# Altium integrated library Samtec_2,54_mm_Pitch_Socket_Strips.IntLib: 489 symbols (part 4 of 4) (continued)
## SSW-120-22-L-D-VS-N (continued)
SQ Post Socket, Surface Mount, Vertical, -55 to 125 degC, 2.54 mm Pitch, 40-Pin, Female, RoHS; Manufacturer: Samtec; PartNumber: SSW-120-22-L-D-VS-N; Pitch: 2.54 mm; DatasheetVersion: F-214; PackageVersion: AS, 1/1997; PackageReference: SSW-120-22-X-D-VS-N; PackageDescription: .100 [2.54] Surface Mount Assembly; Orientation: Vertical; RoHS: True; Temperature Range: -55 to 125 degC; Mounting Technology: Surface Mount; ComponentLink1Description: Manufacturer URL; ComponentLink1URL: http://www.samtec.com; ComponentLink2Description: Datasheet; ComponentLink2URL: http://www.samtec.com/documents/webfiles/pdf/SSW_SM.PDF; ComponentLink3Description: Package Specification; ComponentLink3URL: http://www.samtec.com/documents/webfiles/cpdf/SSW-1XX-22-XXX-X-XX-XX-X-XX-MKT.pdf
footprint SMTC-SSW-120-22-X-D-VS-N (SQ Post Socket, 2x20 Pins, Vertical, 2.54mm Pitch, Female)
pins: 1, 2, 3, 4, 5, 6, 7, 8, 9, 10, 11, 12, 13, 14, 15, 16, 17, 18, 19, 20, 21, 22, 23, 24, 25, 26, 27, 28, 29, 30, 31, 32, 33, 34, 35, 36, 37, 38, 39, 40

## SSW-120-22-L-D-VS-P
designator J?
SQ Post Socket, Surface Mount, Vertical, -55 to 125 degC, 2.54 mm Pitch, 40-Pin, Female, RoHS; Manufacturer: Samtec; PartNumber: SSW-120-22-L-D-VS-P; Pitch: 2.54 mm; DatasheetVersion: F-214; PackageVersion: AS, 1/1997; PackageReference: SSW-120-22-X-D-VS-P; PackageDescription: .100 [2.54] Surface Mount Assembly; Orientation: Vertical; RoHS: True; Temperature Range: -55 to 125 degC; Mounting Technology: Surface Mount; ComponentLink1Description: Manufacturer URL; ComponentLink1URL: http://www.samtec.com; ComponentLink2Description: Datasheet; ComponentLink2URL: http://www.samtec.com/documents/webfiles/pdf/SSW_SM.PDF; ComponentLink3Description: Package Specification; ComponentLink3URL: http://www.samtec.com/documents/webfiles/cpdf/SSW-1XX-22-XXX-X-XX-XX-X-XX-MKT.pdf
footprint SMTC-SSW-120-22-X-D-VS-P (SQ Post Socket, 2x20 Pins, Vertical, 2.54mm Pitch, Female)
pins: 1, 2, 3, 4, 5, 6, 7, 8, 9, 10, 11, 12, 13, 14, 15, 16, 17, 18, 19, 20, 21, 22, 23, 24, 25, 26, 27, 28, 29, 30, 31, 32, 33, 34, 35, 36, 37, 38, 39, 40

## SSW-123-06-F-D
designator J?
SQ Post Socket, Through-hole, Vertical, -55 to 125 degC, 2.54 mm Pitch, 46-Pin, Female, RoHS; Manufacturer: Samtec; PartNumber: SSW-123-06-F-D; Pitch: 2.54 mm; DatasheetVersion: F-214; PackageVersion: CA, 6/1987; PackageReference: SSW-123-06-X-D; PackageDescription: Assembly, Socket Strip .016 X .031 Tail; Orientation: Vertical; RoHS: True; Temperature Range: -55 to 125 degC; Mounting Technology: Through-hole; ComponentLink1Description: Manufacturer URL; ComponentLink1URL: http://www.samtec.com; ComponentLink2Description: Datasheet; ComponentLink2URL: http://www.samtec.com/documents/webfiles/pdf/SSW_TH.PDF; ComponentLink3Description: Package Specification; ComponentLink3URL: http://www.samtec.com/documents/webfiles/cpdf/SSW-1XX-XX-XXX-X-XX-XXX-XX-MKT.pdf
footprint SMTC-SSW-123-06-X-D (SQ Post Socket, 2x23 Pins, Vertical, 2.54mm Pitch, Female)
pins: 1, 2, 3, 4, 5, 6, 7, 8, 9, 10, 11, 12, 13, 14, 15, 16, 17, 18, 19, 20, 21, 22, 23, 24, 25, 26, 27, 28, 29, 30, 31, 32, 33, 34, 35, 36, 37, 38, 39, 40, 41, 42, 43, 44, 45, 46

## SSW-123-06-G-D
designator J?
SQ Post Socket, Through-hole, Vertical, -55 to 125 degC, 2.54 mm Pitch, 46-Pin, Female, RoHS; Manufacturer: Samtec; PartNumber: SSW-123-06-G-D; Pitch: 2.54 mm; DatasheetVersion: F-214; PackageVersion: CA, 6/1987; PackageReference: SSW-123-06-X-D; PackageDescription: Assembly, Socket Strip .016 X .031 Tail; Orientation: Vertical; RoHS: True; Temperature Range: -55 to 125 degC; Mounting Technology: Through-hole; ComponentLink1Description: Manufacturer URL; ComponentLink1URL: http://www.samtec.com; ComponentLink2Description: Datasheet; ComponentLink2URL: http://www.samtec.com/documents/webfiles/pdf/SSW_TH.PDF; ComponentLink3Description: Package Specification; ComponentLink3URL: http://www.samtec.com/documents/webfiles/cpdf/SSW-1XX-XX-XXX-X-XX-XXX-XX-MKT.pdf
footprint SMTC-SSW-123-06-X-D (SQ Post Socket, 2x23 Pins, Vertical, 2.54mm Pitch, Female)
pins: 1, 2, 3, 4, 5, 6, 7, 8, 9, 10, 11, 12, 13, 14, 15, 16, 17, 18, 19, 20, 21, 22, 23, 24, 25, 26, 27, 28, 29, 30, 31, 32, 33, 34, 35, 36, 37, 38, 39, 40, 41, 42, 43, 44, 45, 46

## SSW-123-06-L-D
designator J?
SQ Post Socket, Through-hole, Vertical, -55 to 125 degC, 2.54 mm Pitch, 46-Pin, Female, RoHS; Manufacturer: Samtec; PartNumber: SSW-123-06-L-D; Pitch: 2.54 mm; DatasheetVersion: F-214; PackageVersion: CA, 6/1987; PackageReference: SSW-123-06-X-D; PackageDescription: Assembly, Socket Strip .016 X .031 Tail; Orientation: Vertical; RoHS: True; Temperature Range: -55 to 125 degC; Mounting Technology: Through-hole; ComponentLink1Description: Manufacturer URL; ComponentLink1URL: http://www.samtec.com; ComponentLink2Description: Datasheet; ComponentLink2URL: http://www.samtec.com/documents/webfiles/pdf/SSW_TH.PDF; ComponentLink3Description: Package Specification; ComponentLink3URL: http://www.samtec.com/documents/webfiles/cpdf/SSW-1XX-XX-XXX-X-XX-XXX-XX-MKT.pdf
footprint SMTC-SSW-123-06-X-D (SQ Post Socket, 2x23 Pins, Vertical, 2.54mm Pitch, Female)
pins: 1, 2, 3, 4, 5, 6, 7, 8, 9, 10, 11, 12, 13, 14, 15, 16, 17, 18, 19, 20, 21, 22, 23, 24, 25, 26, 27, 28, 29, 30, 31, 32, 33, 34, 35, 36, 37, 38, 39, 40, 41, 42, 43, 44, 45, 46

## SSW-123-06-T-D
designator J?
SQ Post Socket, Through-hole, Vertical, -55 to 105 degC, 2.54 mm Pitch, 46-Pin, Female, RoHS; Manufacturer: Samtec; PartNumber: SSW-123-06-T-D; Pitch: 2.54 mm; DatasheetVersion: F-214; PackageVersion: CA, 6/1987; PackageReference: SSW-123-06-X-D; PackageDescription: Assembly, Socket Strip .016 X .031 Tail; Orientation: Vertical; RoHS: True; Temperature Range: -55 to 105 degC; Mounting Technology: Through-hole; ComponentLink1Description: Manufacturer URL; ComponentLink1URL: http://www.samtec.com; ComponentLink2Description: Datasheet; ComponentLink2URL: http://www.samtec.com/documents/webfiles/pdf/SSW_TH.PDF; ComponentLink3Description: Package Specification; ComponentLink3URL: http://www.samtec.com/documents/webfiles/cpdf/SSW-1XX-XX-XXX-X-XX-XXX-XX-MKT.pdf
footprint SMTC-SSW-123-06-X-D (SQ Post Socket, 2x23 Pins, Vertical, 2.54mm Pitch, Female)
pins: 1, 2, 3, 4, 5, 6, 7, 8, 9, 10, 11, 12, 13, 14, 15, 16, 17, 18, 19, 20, 21, 22, 23, 24, 25, 26, 27, 28, 29, 30, 31, 32, 33, 34, 35, 36, 37, 38, 39, 40, 41, 42, 43, 44, 45, 46

## SSW-125-01-F-D
designator J?
SQ Post Socket, Through-hole, Vertical, -55 to 125 degC, 2.54 mm Pitch, 50-Pin, Female, RoHS; Manufacturer: Samtec; PartNumber: SSW-125-01-F-D; Pitch: 2.54 mm; DatasheetVersion: F-214; PackageVersion: CA, 6/1987; PackageReference: SSW-125-01-X-D; PackageDescription: Assembly, Socket Strip .016 X .031 Tail; Supplier 1: Newark; Supplier Part Number 1: 40P2157; Orientation: Vertical; RoHS: True; Temperature Range: -55 to 125 degC; Mounting Technology: Through-hole; ComponentLink1Description: Manufacturer URL; ComponentLink1URL: http://www.samtec.com; ComponentLink2Description: Datasheet; ComponentLink2URL: http://www.samtec.com/documents/webfiles/pdf/SSW_TH.PDF; ComponentLink3Description: Package Specification; ComponentLink3URL: http://www.samtec.com/documents/webfiles/cpdf/SSW-1XX-XX-XXX-X-XX-XXX-XX-MKT.pdf
footprint SMTC-SSW-125-01-X-D (SQ Post Socket, 2x25 Pins, Vertical, 2.54mm Pitch, Female)
pins: 1, 2, 3, 4, 5, 6, 7, 8, 9, 10, 11, 12, 13, 14, 15, 16, 17, 18, 19, 20, 21, 22, 23, 24, 25, 26, 27, 28, 29, 30, 31, 32, 33, 34, 35, 36, 37, 38, 39, 40, 41, 42, 43, 44, 45, 46, 47, 48, 49, 50

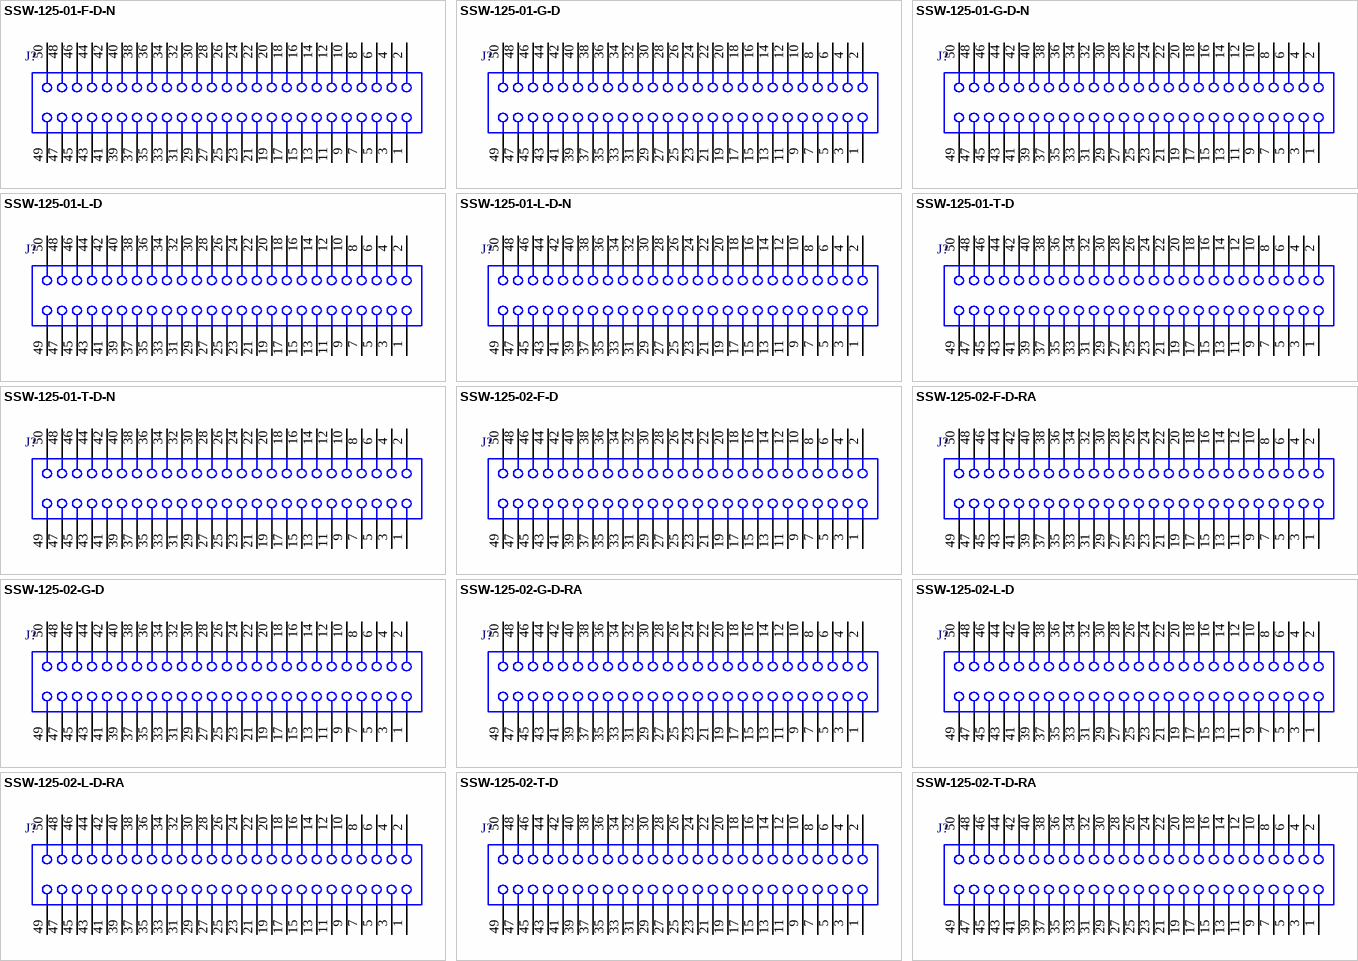
[diagram p13: symbols SSW-125-01-F-D-N to SSW-125-02-T-D-RA]

## SSW-125-01-F-D-N
designator J?
SQ Post Socket, Through-hole, Vertical, -55 to 125 degC, 2.54 mm Pitch, 50-Pin, Female, RoHS; Manufacturer: Samtec; PartNumber: SSW-125-01-F-D-N; Pitch: 2.54 mm; DatasheetVersion: F-214; PackageVersion: CA, 6/1987; PackageReference: SSW-125-01-X-D-N; PackageDescription: Assembly, Socket Strip .016 X .031 Tail; Orientation: Vertical; RoHS: True; Temperature Range: -55 to 125 degC; Mounting Technology: Through-hole; ComponentLink1Description: Manufacturer URL; ComponentLink1URL: http://www.samtec.com; ComponentLink2Description: Datasheet; ComponentLink2URL: http://www.samtec.com/documents/webfiles/pdf/SSW_TH.PDF; ComponentLink3Description: Package Specification; ComponentLink3URL: http://www.samtec.com/documents/webfiles/cpdf/SSW-1XX-XX-XXX-X-XX-XXX-XX-MKT.pdf
footprint SMTC-SSW-125-01-X-D-N (SQ Post Socket, 2x25 Pins, Vertical, 2.54mm Pitch, Female)
pins: 1, 2, 3, 4, 5, 6, 7, 8, 9, 10, 11, 12, 13, 14, 15, 16, 17, 18, 19, 20, 21, 22, 23, 24, 25, 26, 27, 28, 29, 30, 31, 32, 33, 34, 35, 36, 37, 38, 39, 40, 41, 42, 43, 44, 45, 46, 47, 48, 49, 50

## SSW-125-01-G-D
designator J?
SQ Post Socket, Through-hole, Vertical, -55 to 125 degC, 2.54 mm Pitch, 50-Pin, Female, RoHS; Manufacturer: Samtec; PartNumber: SSW-125-01-G-D; Pitch: 2.54 mm; DatasheetVersion: F-214; PackageVersion: CA, 6/1987; PackageReference: SSW-125-01-X-D; PackageDescription: Assembly, Socket Strip .016 X .031 Tail; Supplier 1: Digi-Key; Supplier Part Number 1: SAM1208-25-ND; Supplier 2: Farnell; Supplier Part Number 2: 1668403; Supplier 3: Newark; Supplier Part Number 3: 11P9714; Orientation: Vertical; RoHS: True; Temperature Range: -55 to 125 degC; Mounting Technology: Through-hole; ComponentLink1Description: Manufacturer URL; ComponentLink1URL: http://www.samtec.com; ComponentLink2Description: Datasheet; ComponentLink2URL: http://www.samtec.com/documents/webfiles/pdf/SSW_TH.PDF; ComponentLink3Description: Package Specification; ComponentLink3URL: http://www.samtec.com/documents/webfiles/cpdf/SSW-1XX-XX-XXX-X-XX-XXX-XX-MKT.pdf
footprint SMTC-SSW-125-01-X-D (SQ Post Socket, 2x25 Pins, Vertical, 2.54mm Pitch, Female)
pins: 1, 2, 3, 4, 5, 6, 7, 8, 9, 10, 11, 12, 13, 14, 15, 16, 17, 18, 19, 20, 21, 22, 23, 24, 25, 26, 27, 28, 29, 30, 31, 32, 33, 34, 35, 36, 37, 38, 39, 40, 41, 42, 43, 44, 45, 46, 47, 48, 49, 50

## SSW-125-01-G-D-N
designator J?
SQ Post Socket, Through-hole, Vertical, -55 to 125 degC, 2.54 mm Pitch, 50-Pin, Female, RoHS; Manufacturer: Samtec; PartNumber: SSW-125-01-G-D-N; Pitch: 2.54 mm; DatasheetVersion: F-214; PackageVersion: CA, 6/1987; PackageReference: SSW-125-01-X-D-N; PackageDescription: Assembly, Socket Strip .016 X .031 Tail; Orientation: Vertical; RoHS: True; Temperature Range: -55 to 125 degC; Mounting Technology: Through-hole; ComponentLink1Description: Manufacturer URL; ComponentLink1URL: http://www.samtec.com; ComponentLink2Description: Datasheet; ComponentLink2URL: http://www.samtec.com/documents/webfiles/pdf/SSW_TH.PDF; ComponentLink3Description: Package Specification; ComponentLink3URL: http://www.samtec.com/documents/webfiles/cpdf/SSW-1XX-XX-XXX-X-XX-XXX-XX-MKT.pdf
footprint SMTC-SSW-125-01-X-D-N (SQ Post Socket, 2x25 Pins, Vertical, 2.54mm Pitch, Female)
pins: 1, 2, 3, 4, 5, 6, 7, 8, 9, 10, 11, 12, 13, 14, 15, 16, 17, 18, 19, 20, 21, 22, 23, 24, 25, 26, 27, 28, 29, 30, 31, 32, 33, 34, 35, 36, 37, 38, 39, 40, 41, 42, 43, 44, 45, 46, 47, 48, 49, 50

## SSW-125-01-L-D
designator J?
SQ Post Socket, Through-hole, Vertical, -55 to 125 degC, 2.54 mm Pitch, 50-Pin, Female, RoHS; Manufacturer: Samtec; PartNumber: SSW-125-01-L-D; Pitch: 2.54 mm; DatasheetVersion: F-214; PackageVersion: CA, 6/1987; PackageReference: SSW-125-01-X-D; PackageDescription: Assembly, Socket Strip .016 X .031 Tail; Supplier 1: Newark; Supplier Part Number 1: 44W9136; Orientation: Vertical; RoHS: True; Temperature Range: -55 to 125 degC; Mounting Technology: Through-hole; ComponentLink1Description: Manufacturer URL; ComponentLink1URL: http://www.samtec.com; ComponentLink2Description: Datasheet; ComponentLink2URL: http://www.samtec.com/documents/webfiles/pdf/SSW_TH.PDF; ComponentLink3Description: Package Specification; ComponentLink3URL: http://www.samtec.com/documents/webfiles/cpdf/SSW-1XX-XX-XXX-X-XX-XXX-XX-MKT.pdf
footprint SMTC-SSW-125-01-X-D (SQ Post Socket, 2x25 Pins, Vertical, 2.54mm Pitch, Female)
pins: 1, 2, 3, 4, 5, 6, 7, 8, 9, 10, 11, 12, 13, 14, 15, 16, 17, 18, 19, 20, 21, 22, 23, 24, 25, 26, 27, 28, 29, 30, 31, 32, 33, 34, 35, 36, 37, 38, 39, 40, 41, 42, 43, 44, 45, 46, 47, 48, 49, 50

## SSW-125-01-L-D-N
designator J?
SQ Post Socket, Through-hole, Vertical, -55 to 125 degC, 2.54 mm Pitch, 50-Pin, Female, RoHS; Manufacturer: Samtec; PartNumber: SSW-125-01-L-D-N; Pitch: 2.54 mm; DatasheetVersion: F-214; PackageVersion: CA, 6/1987; PackageReference: SSW-125-01-X-D-N; PackageDescription: Assembly, Socket Strip .016 X .031 Tail; Orientation: Vertical; RoHS: True; Temperature Range: -55 to 125 degC; Mounting Technology: Through-hole; ComponentLink1Description: Manufacturer URL; ComponentLink1URL: http://www.samtec.com; ComponentLink2Description: Datasheet; ComponentLink2URL: http://www.samtec.com/documents/webfiles/pdf/SSW_TH.PDF; ComponentLink3Description: Package Specification; ComponentLink3URL: http://www.samtec.com/documents/webfiles/cpdf/SSW-1XX-XX-XXX-X-XX-XXX-XX-MKT.pdf
footprint SMTC-SSW-125-01-X-D-N (SQ Post Socket, 2x25 Pins, Vertical, 2.54mm Pitch, Female)
pins: 1, 2, 3, 4, 5, 6, 7, 8, 9, 10, 11, 12, 13, 14, 15, 16, 17, 18, 19, 20, 21, 22, 23, 24, 25, 26, 27, 28, 29, 30, 31, 32, 33, 34, 35, 36, 37, 38, 39, 40, 41, 42, 43, 44, 45, 46, 47, 48, 49, 50

## SSW-125-01-T-D
designator J?
SQ Post Socket, Through-hole, Vertical, -55 to 105 degC, 2.54 mm Pitch, 50-Pin, Female, RoHS; Manufacturer: Samtec; PartNumber: SSW-125-01-T-D; Pitch: 2.54 mm; DatasheetVersion: F-214; PackageVersion: CA, 6/1987; PackageReference: SSW-125-01-X-D; PackageDescription: Assembly, Socket Strip .016 X .031 Tail; Supplier 1: Digi-Key; Supplier Part Number 1: SAM1212-25-ND; Supplier 2: Farnell; Supplier Part Number 2: 2308495; Supplier 3: Newark; Supplier Part Number 3: 11P9717; Supplier 4: Newark; Supplier Part Number 4: 70W0681; Orientation: Vertical; RoHS: True; Temperature Range: -55 to 105 degC; Mounting Technology: Through-hole; ComponentLink1Description: Manufacturer URL; ComponentLink1URL: http://www.samtec.com; ComponentLink2Description: Datasheet; ComponentLink2URL: http://www.samtec.com/documents/webfiles/pdf/SSW_TH.PDF; ComponentLink3Description: Package Specification; ComponentLink3URL: http://www.samtec.com/documents/webfiles/cpdf/SSW-1XX-XX-XXX-X-XX-XXX-XX-MKT.pdf
footprint SMTC-SSW-125-01-X-D (SQ Post Socket, 2x25 Pins, Vertical, 2.54mm Pitch, Female)
pins: 1, 2, 3, 4, 5, 6, 7, 8, 9, 10, 11, 12, 13, 14, 15, 16, 17, 18, 19, 20, 21, 22, 23, 24, 25, 26, 27, 28, 29, 30, 31, 32, 33, 34, 35, 36, 37, 38, 39, 40, 41, 42, 43, 44, 45, 46, 47, 48, 49, 50

## SSW-125-01-T-D-N
designator J?
SQ Post Socket, Through-hole, Vertical, -55 to 105 degC, 2.54 mm Pitch, 50-Pin, Female, RoHS; Manufacturer: Samtec; PartNumber: SSW-125-01-T-D-N; Pitch: 2.54 mm; DatasheetVersion: F-214; PackageVersion: CA, 6/1987; PackageReference: SSW-125-01-X-D-N; PackageDescription: Assembly, Socket Strip .016 X .031 Tail; Orientation: Vertical; RoHS: True; Temperature Range: -55 to 105 degC; Mounting Technology: Through-hole; ComponentLink1Description: Manufacturer URL; ComponentLink1URL: http://www.samtec.com; ComponentLink2Description: Datasheet; ComponentLink2URL: http://www.samtec.com/documents/webfiles/pdf/SSW_TH.PDF; ComponentLink3Description: Package Specification; ComponentLink3URL: http://www.samtec.com/documents/webfiles/cpdf/SSW-1XX-XX-XXX-X-XX-XXX-XX-MKT.pdf
footprint SMTC-SSW-125-01-X-D-N (SQ Post Socket, 2x25 Pins, Vertical, 2.54mm Pitch, Female)
pins: 1, 2, 3, 4, 5, 6, 7, 8, 9, 10, 11, 12, 13, 14, 15, 16, 17, 18, 19, 20, 21, 22, 23, 24, 25, 26, 27, 28, 29, 30, 31, 32, 33, 34, 35, 36, 37, 38, 39, 40, 41, 42, 43, 44, 45, 46, 47, 48, 49, 50

## SSW-125-02-F-D
designator J?
SQ Post Socket, Through-hole, Vertical, -55 to 125 degC, 2.54 mm Pitch, 50-Pin, Female, RoHS; Manufacturer: Samtec; PartNumber: SSW-125-02-F-D; Pitch: 2.54 mm; DatasheetVersion: F-214; PackageVersion: CA, 6/1987; PackageReference: SSW-125-02-X-D; PackageDescription: Assembly, Socket Strip .016 X .031 Tail; Orientation: Vertical; RoHS: True; Temperature Range: -55 to 125 degC; Mounting Technology: Through-hole; ComponentLink1Description: Manufacturer URL; ComponentLink1URL: http://www.samtec.com; ComponentLink2Description: Datasheet; ComponentLink2URL: http://www.samtec.com/documents/webfiles/pdf/SSW_TH.PDF; ComponentLink3Description: Package Specification; ComponentLink3URL: http://www.samtec.com/documents/webfiles/cpdf/SSW-1XX-XX-XXX-X-XX-XXX-XX-MKT.pdf
footprint SMTC-SSW-125-02-X-D (SQ Post Socket, 2x25 Pins, Vertical, 2.54mm Pitch, Female)
pins: 1, 2, 3, 4, 5, 6, 7, 8, 9, 10, 11, 12, 13, 14, 15, 16, 17, 18, 19, 20, 21, 22, 23, 24, 25, 26, 27, 28, 29, 30, 31, 32, 33, 34, 35, 36, 37, 38, 39, 40, 41, 42, 43, 44, 45, 46, 47, 48, 49, 50

## SSW-125-02-F-D-RA
designator J?
SQ Post Socket, Through-hole, Right Angle, -55 to 125 degC, 2.54 mm Pitch, 50-Pin, Female, RoHS; Manufacturer: Samtec; PartNumber: SSW-125-02-F-D-RA; Pitch: 2.54 mm; DatasheetVersion: F-214; PackageVersion: CA, 6/1987; PackageReference: SSW-125-02-X-D-RA; PackageDescription: Assembly, Socket Strip .016 X .031 Tail; Supplier 1: Newark; Supplier Part Number 1: 15P4377; Orientation: Right Angle; RoHS: True; Temperature Range: -55 to 125 degC; Mounting Technology: Through-hole; ComponentLink1Description: Manufacturer URL; ComponentLink1URL: http://www.samtec.com; ComponentLink2Description: Datasheet; ComponentLink2URL: http://www.samtec.com/documents/webfiles/pdf/SSW_TH.PDF; ComponentLink3Description: Package Specification; ComponentLink3URL: http://www.samtec.com/documents/webfiles/cpdf/SSW-1XX-XX-XXX-X-XX-XXX-XX-MKT.pdf
footprint SMTC-SSW-125-02-X-D-RA (SQ Post Socket, 2x25 Pins, Right Angle, 2.54mm Pitch, Female)
pins: 1, 2, 3, 4, 5, 6, 7, 8, 9, 10, 11, 12, 13, 14, 15, 16, 17, 18, 19, 20, 21, 22, 23, 24, 25, 26, 27, 28, 29, 30, 31, 32, 33, 34, 35, 36, 37, 38, 39, 40, 41, 42, 43, 44, 45, 46, 47, 48, 49, 50

## SSW-125-02-G-D
designator J?
SQ Post Socket, Through-hole, Vertical, -55 to 125 degC, 2.54 mm Pitch, 50-Pin, Female, RoHS; Manufacturer: Samtec; PartNumber: SSW-125-02-G-D; Pitch: 2.54 mm; DatasheetVersion: F-214; PackageVersion: CA, 6/1987; PackageReference: SSW-125-02-X-D; PackageDescription: Assembly, Socket Strip .016 X .031 Tail; Supplier 1: Digi-Key; Supplier Part Number 1: SAM1214-25-ND; Supplier 2: Farnell; Supplier Part Number 2: 1668404; Supplier 3: Newark; Supplier Part Number 3: 15P2934; Supplier 4: Newark; Supplier Part Number 4: 11P9719; Orientation: Vertical; RoHS: True; Temperature Range: -55 to 125 degC; Mounting Technology: Through-hole; ComponentLink1Description: Manufacturer URL; ComponentLink1URL: http://www.samtec.com; ComponentLink2Description: Datasheet; ComponentLink2URL: http://www.samtec.com/documents/webfiles/pdf/SSW_TH.PDF; ComponentLink3Description: Package Specification; ComponentLink3URL: http://www.samtec.com/documents/webfiles/cpdf/SSW-1XX-XX-XXX-X-XX-XXX-XX-MKT.pdf
footprint SMTC-SSW-125-02-X-D (SQ Post Socket, 2x25 Pins, Vertical, 2.54mm Pitch, Female)
pins: 1, 2, 3, 4, 5, 6, 7, 8, 9, 10, 11, 12, 13, 14, 15, 16, 17, 18, 19, 20, 21, 22, 23, 24, 25, 26, 27, 28, 29, 30, 31, 32, 33, 34, 35, 36, 37, 38, 39, 40, 41, 42, 43, 44, 45, 46, 47, 48, 49, 50

## SSW-125-02-G-D-RA
designator J?
SQ Post Socket, Through-hole, Right Angle, -55 to 125 degC, 2.54 mm Pitch, 50-Pin, Female, RoHS; Manufacturer: Samtec; PartNumber: SSW-125-02-G-D-RA; Pitch: 2.54 mm; DatasheetVersion: F-214; PackageVersion: CA, 6/1987; PackageReference: SSW-125-02-X-D-RA; PackageDescription: Assembly, Socket Strip .016 X .031 Tail; Supplier 1: Digi-Key; Supplier Part Number 1: SAM1215-25-ND; Supplier 2: Farnell; Supplier Part Number 2: 1668405; Supplier 3: Newark; Supplier Part Number 3: 15P2935; Supplier 4: Newark; Supplier Part Number 4: 11P9720; Orientation: Right Angle; RoHS: True; Temperature Range: -55 to 125 degC; Mounting Technology: Through-hole; ComponentLink1Description: Manufacturer URL; ComponentLink1URL: http://www.samtec.com; ComponentLink2Description: Datasheet; ComponentLink2URL: http://www.samtec.com/documents/webfiles/pdf/SSW_TH.PDF; ComponentLink3Description: Package Specification; ComponentLink3URL: http://www.samtec.com/documents/webfiles/cpdf/SSW-1XX-XX-XXX-X-XX-XXX-XX-MKT.pdf
footprint SMTC-SSW-125-02-X-D-RA (SQ Post Socket, 2x25 Pins, Right Angle, 2.54mm Pitch, Female)
pins: 1, 2, 3, 4, 5, 6, 7, 8, 9, 10, 11, 12, 13, 14, 15, 16, 17, 18, 19, 20, 21, 22, 23, 24, 25, 26, 27, 28, 29, 30, 31, 32, 33, 34, 35, 36, 37, 38, 39, 40, 41, 42, 43, 44, 45, 46, 47, 48, 49, 50

## SSW-125-02-L-D
designator J?
SQ Post Socket, Through-hole, Vertical, -55 to 125 degC, 2.54 mm Pitch, 50-Pin, Female, RoHS; Manufacturer: Samtec; PartNumber: SSW-125-02-L-D; Pitch: 2.54 mm; DatasheetVersion: F-214; PackageVersion: CA, 6/1987; PackageReference: SSW-125-02-X-D; PackageDescription: Assembly, Socket Strip .016 X .031 Tail; Orientation: Vertical; RoHS: True; Temperature Range: -55 to 125 degC; Mounting Technology: Through-hole; ComponentLink1Description: Manufacturer URL; ComponentLink1URL: http://www.samtec.com; ComponentLink2Description: Datasheet; ComponentLink2URL: http://www.samtec.com/documents/webfiles/pdf/SSW_TH.PDF; ComponentLink3Description: Package Specification; ComponentLink3URL: http://www.samtec.com/documents/webfiles/cpdf/SSW-1XX-XX-XXX-X-XX-XXX-XX-MKT.pdf
footprint SMTC-SSW-125-02-X-D (SQ Post Socket, 2x25 Pins, Vertical, 2.54mm Pitch, Female)
pins: 1, 2, 3, 4, 5, 6, 7, 8, 9, 10, 11, 12, 13, 14, 15, 16, 17, 18, 19, 20, 21, 22, 23, 24, 25, 26, 27, 28, 29, 30, 31, 32, 33, 34, 35, 36, 37, 38, 39, 40, 41, 42, 43, 44, 45, 46, 47, 48, 49, 50

## SSW-125-02-L-D-RA
designator J?
SQ Post Socket, Through-hole, Right Angle, -55 to 125 degC, 2.54 mm Pitch, 50-Pin, Female, RoHS; Manufacturer: Samtec; PartNumber: SSW-125-02-L-D-RA; Pitch: 2.54 mm; DatasheetVersion: F-214; PackageVersion: CA, 6/1987; PackageReference: SSW-125-02-X-D-RA; PackageDescription: Assembly, Socket Strip .016 X .031 Tail; Orientation: Right Angle; RoHS: True; Temperature Range: -55 to 125 degC; Mounting Technology: Through-hole; ComponentLink1Description: Manufacturer URL; ComponentLink1URL: http://www.samtec.com; ComponentLink2Description: Datasheet; ComponentLink2URL: http://www.samtec.com/documents/webfiles/pdf/SSW_TH.PDF; ComponentLink3Description: Package Specification; ComponentLink3URL: http://www.samtec.com/documents/webfiles/cpdf/SSW-1XX-XX-XXX-X-XX-XXX-XX-MKT.pdf
footprint SMTC-SSW-125-02-X-D-RA (SQ Post Socket, 2x25 Pins, Right Angle, 2.54mm Pitch, Female)
pins: 1, 2, 3, 4, 5, 6, 7, 8, 9, 10, 11, 12, 13, 14, 15, 16, 17, 18, 19, 20, 21, 22, 23, 24, 25, 26, 27, 28, 29, 30, 31, 32, 33, 34, 35, 36, 37, 38, 39, 40, 41, 42, 43, 44, 45, 46, 47, 48, 49, 50

## SSW-125-02-T-D
designator J?
SQ Post Socket, Through-hole, Vertical, -55 to 105 degC, 2.54 mm Pitch, 50-Pin, Female, RoHS; Manufacturer: Samtec; PartNumber: SSW-125-02-T-D; Pitch: 2.54 mm; DatasheetVersion: F-214; PackageVersion: CA, 6/1987; PackageReference: SSW-125-02-X-D; PackageDescription: Assembly, Socket Strip .016 X .031 Tail; Supplier 1: Digi-Key; Supplier Part Number 1: SAM1221-25-ND; Orientation: Vertical; RoHS: True; Temperature Range: -55 to 105 degC; Mounting Technology: Through-hole; ComponentLink1Description: Manufacturer URL; ComponentLink1URL: http://www.samtec.com; ComponentLink2Description: Datasheet; ComponentLink2URL: http://www.samtec.com/documents/webfiles/pdf/SSW_TH.PDF; ComponentLink3Description: Package Specification; ComponentLink3URL: http://www.samtec.com/documents/webfiles/cpdf/SSW-1XX-XX-XXX-X-XX-XXX-XX-MKT.pdf
footprint SMTC-SSW-125-02-X-D (SQ Post Socket, 2x25 Pins, Vertical, 2.54mm Pitch, Female)
pins: 1, 2, 3, 4, 5, 6, 7, 8, 9, 10, 11, 12, 13, 14, 15, 16, 17, 18, 19, 20, 21, 22, 23, 24, 25, 26, 27, 28, 29, 30, 31, 32, 33, 34, 35, 36, 37, 38, 39, 40, 41, 42, 43, 44, 45, 46, 47, 48, 49, 50

## SSW-125-02-T-D-RA
designator J?
SQ Post Socket, Through-hole, Right Angle, -55 to 105 degC, 2.54 mm Pitch, 50-Pin, Female, RoHS; Manufacturer: Samtec; PartNumber: SSW-125-02-T-D-RA; Pitch: 2.54 mm; DatasheetVersion: F-214; PackageVersion: CA, 6/1987; PackageReference: SSW-125-02-X-D-RA; PackageDescription: Assembly, Socket Strip .016 X .031 Tail; Supplier 1: Newark; Supplier Part Number 1: 82P9310; Orientation: Right Angle; RoHS: True; Temperature Range: -55 to 105 degC; Mounting Technology: Through-hole; ComponentLink1Description: Manufacturer URL; ComponentLink1URL: http://www.samtec.com; ComponentLink2Description: Datasheet; ComponentLink2URL: http://www.samtec.com/documents/webfiles/pdf/SSW_TH.PDF; ComponentLink3Description: Package Specification; ComponentLink3URL: http://www.samtec.com/documents/webfiles/cpdf/SSW-1XX-XX-XXX-X-XX-XXX-XX-MKT.pdf
footprint SMTC-SSW-125-02-X-D-RA (SQ Post Socket, 2x25 Pins, Right Angle, 2.54mm Pitch, Female)
pins: 1, 2, 3, 4, 5, 6, 7, 8, 9, 10, 11, 12, 13, 14, 15, 16, 17, 18, 19, 20, 21, 22, 23, 24, 25, 26, 27, 28, 29, 30, 31, 32, 33, 34, 35, 36, 37, 38, 39, 40, 41, 42, 43, 44, 45, 46, 47, 48, 49, 50